# Altium schematic symbol library Regulator_Switching.SchLib: 1070 symbols (part 1 of 9)
Pins are listed as number, name and electrical type; pins without a type are passive.

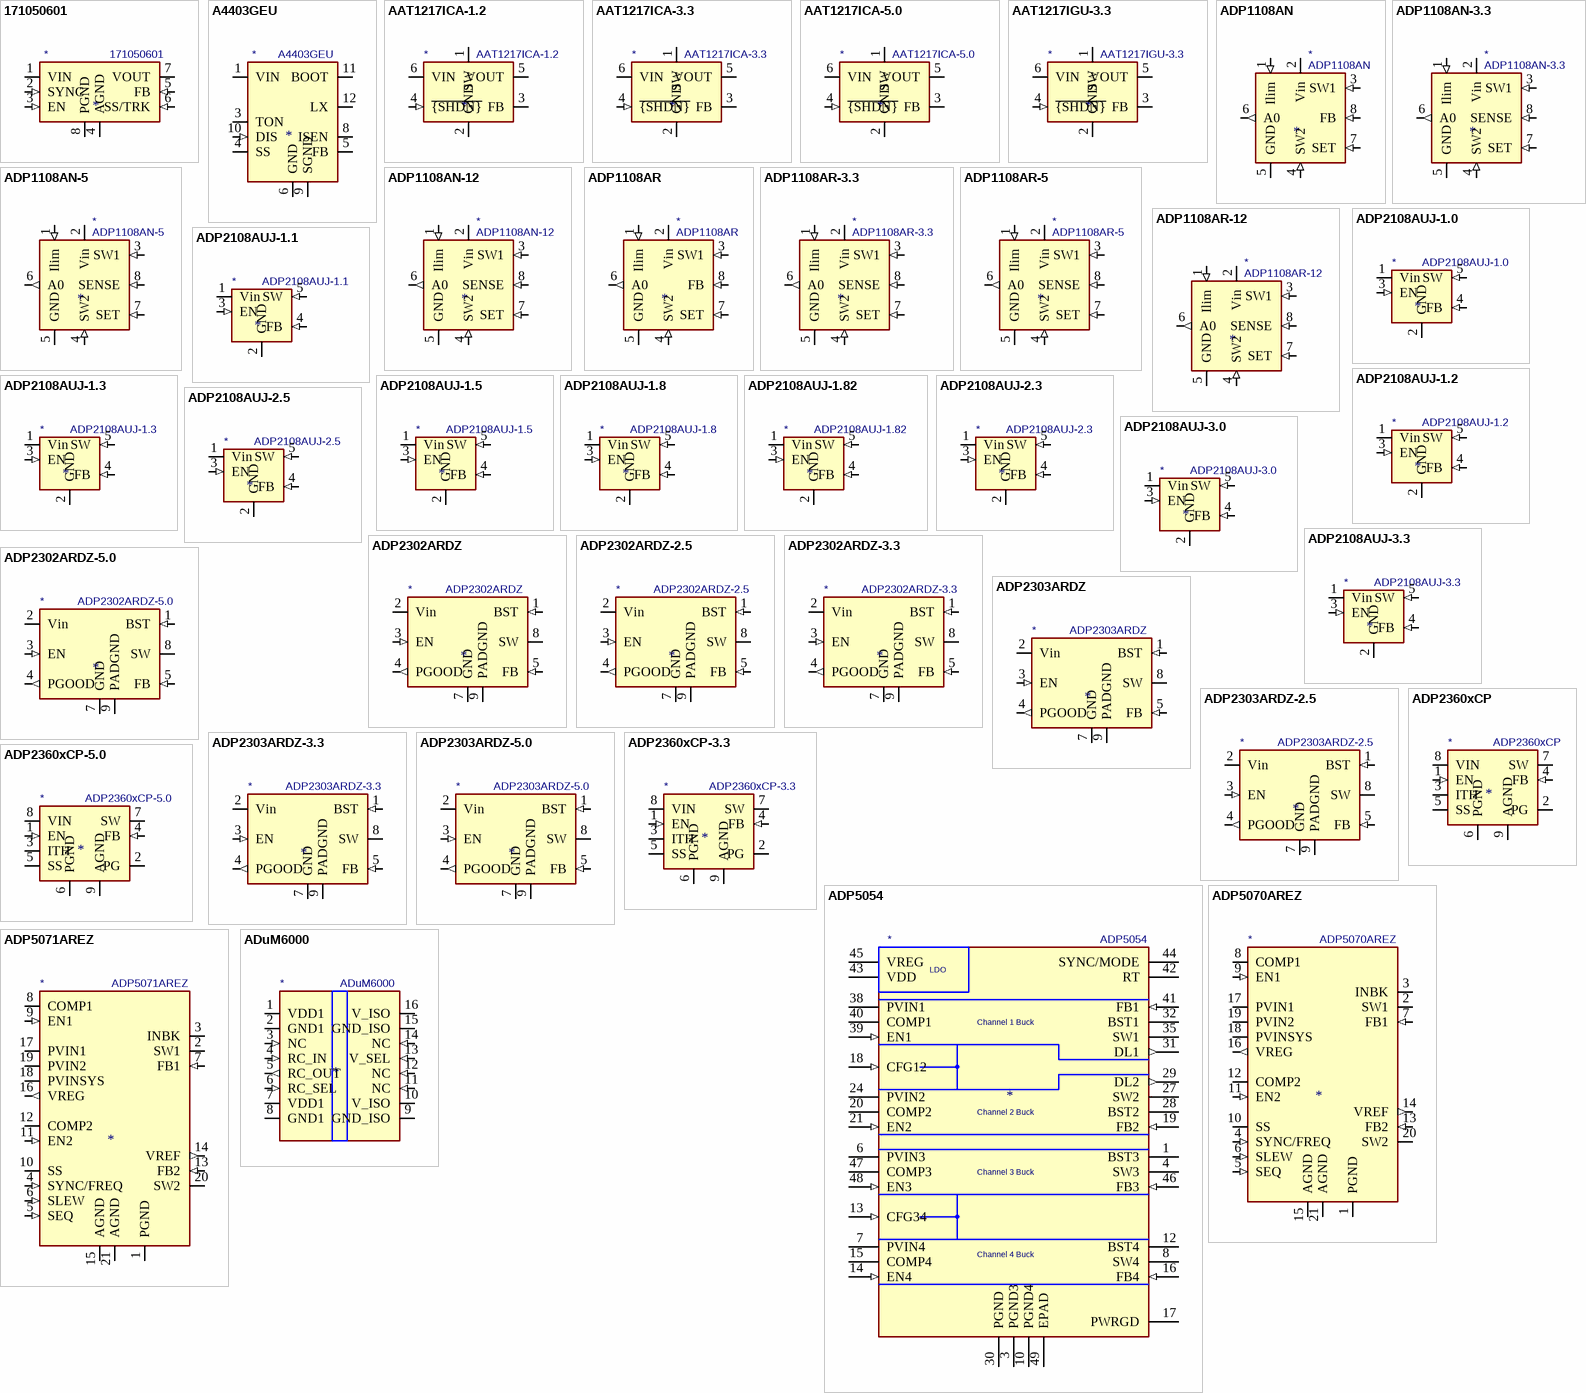
[diagram p0: symbols 171050601 to ADuM6000]

## 171050601
designator *  value 171050601
ki_keywords: power module regulator; ki_description: MagI3C Power Module, Variable Step Down Regulator Module, 6 to 36V Input Voltage, 0.8 to 6V, 5A Output, TO-263; ki_fp_filters: TO*263*TabPin8*; Footprint: Package_TO_SOT_SMD:TO-263-7_TabPin8; Supplier: https://katalog.we-online.de/pm/datasheet/171050601.pdf
footprint TO-263-7_TabPin8
pins: 1 VIN (power), 2 SYNC (in), 3 EN (in), 4 AGND (power), 5 FB (in), 6 SS/TRK (in), 7 VOUT (power), 8 PGND (power)

## A4403GEU
designator *  value A4403GEU
ki_keywords: buck regulator adjustable; ki_description: Valley current mode buck converter, 46V, 3A, up to 2MHz, QFN-16; ki_fp_filters: QFN*1EP*4x4mm*P0.65mm*EP2.7x2.7mm*; Footprint: Package_DFN_QFN:QFN-16-1EP_4x4mm_P0.65mm_EP2.7x2.7mm; Supplier: https://www.allegromicro.com/~/media/Files/Datasheets/A4403-Datasheet.ashx
footprint QFN-16-1EP_4x4mm_P0.65mm_EP2.7x2.7mm
pins: 1 VIN (power), 2 GND hidden, 3 TON, 4 SS, 5 FB, 6 GND (power), 7 GND hidden, 8 ISEN, 9 SGND, 10 DIS (in), 11 BOOT, 12 LX, 13 GND hidden, 14 GND hidden, 15 GND hidden, 16 GND hidden, 17 GND hidden

## AAT1217ICA-1.2
designator *  value AAT1217ICA-1.2
ki_keywords: regulator step-up adjustable; ki_description: 600mA, 2.5-5.5V, 1.2MHz, Micropower Synchronous Step-Up Converter, TSOT-23-6; ki_fp_filters: TSOT?23*; Footprint: Package_TO_SOT_SMD:TSOT-23-6; Supplier: http://www.skyworksinc.com/uploads/documents/AAT1217_202050B.pdf
footprint TSOT-23-6
pins: 1 SW, 2 GND (power), 3 FB, 4 ~{{SHDN}} (in), 5 VOUT (power), 6 VIN (power)

## AAT1217ICA-3.3
designator *  value AAT1217ICA-3.3
ki_keywords: regulator step-up; ki_description: 600mA, 3.3V, 1.2MHz, Micropower Synchronous Step-Up Converter, TSOT-23-6; ki_fp_filters: TSOT?23*; Footprint: Package_TO_SOT_SMD:TSOT-23-6; Supplier: http://www.skyworksinc.com/uploads/documents/AAT1217_202050B.pdf
footprint TSOT-23-6
pins: 1 SW, 2 GND (power), 3 FB, 4 ~{{SHDN}} (in), 5 VOUT (power), 6 VIN (power)

## AAT1217ICA-5.0
designator *  value AAT1217ICA-5.0
ki_keywords: regulator step-up; ki_description: 600mA, 5.0V, 1.2MHz, Micropower Synchronous Step-Up Converter, TSOT-23-6; ki_fp_filters: TSOT?23*; Footprint: Package_TO_SOT_SMD:TSOT-23-6; Supplier: http://www.skyworksinc.com/uploads/documents/AAT1217_202050B.pdf
footprint TSOT-23-6
pins: 1 SW, 2 GND (power), 3 FB, 4 ~{{SHDN}} (in), 5 VOUT (power), 6 VIN (power)

## AAT1217IGU-3.3
designator *  value AAT1217IGU-3.3
ki_keywords: regulator step-up; ki_description: 600mA, 3.3V, 1.2MHz, Micropower Synchronous Step-Up Converter, SOT-23-6; ki_fp_filters: SOT?23*; Footprint: Package_TO_SOT_SMD:SOT-23-6; Supplier: http://www.skyworksinc.com/uploads/documents/AAT1217_202050B.pdf
footprint SOT-23-6
pins: 1 SW, 2 GND (power), 3 FB, 4 ~{{SHDN}} (in), 5 VOUT (power), 6 VIN (power)

## ADP1108AN
designator *  value ADP1108AN
ki_keywords: switching buck boost converter step-down step-up; ki_description: Micropower DC-DC converter, step-up or step-down operation, 2V-30Vin, adjustable output voltage, DIP-8; ki_fp_filters: DIP*W7.62mm*; Footprint: Package_DIP:DIP-8_W7.62mm; Supplier: https://www.analog.com/media/en/technical-documentation/data-sheets/ADP1108.pdf
footprint DIP-8_W7.62mm
pins: 1 Ilim (in), 2 Vin (power), 3 SW1 (in), 4 SW2 (in), 5 GND (power), 6 A0 (out), 7 SET (in), 8 FB (in)

## ADP1108AN-3.3
designator *  value ADP1108AN-3.3
ki_keywords: switching buck boost converter step-down step-up; ki_description: Micropower DC-DC converter, step-up or step-down operation, 2V-30Vin, 3.3V fixed output voltage, DIP-8; ki_fp_filters: DIP*W7.62mm*; Footprint: Package_DIP:DIP-8_W7.62mm; Supplier: https://www.analog.com/media/en/technical-documentation/data-sheets/ADP1108.pdf
footprint DIP-8_W7.62mm
pins: 1 Ilim (in), 2 Vin (power), 3 SW1 (in), 4 SW2 (in), 5 GND (power), 6 A0 (out), 7 SET (in), 8 SENSE (in)

## ADP1108AN-5
designator *  value ADP1108AN-5
ki_keywords: switching buck boost converter step-down step-up; ki_description: Micropower DC-DC converter, step-up or step-down operation, 2V-30Vin, 5V fixed output voltage, DIP-8; ki_fp_filters: DIP*W7.62mm*; Footprint: Package_DIP:DIP-8_W7.62mm; Supplier: https://www.analog.com/media/en/technical-documentation/data-sheets/ADP1108.pdf
footprint DIP-8_W7.62mm
pins: 1 Ilim (in), 2 Vin (power), 3 SW1 (in), 4 SW2 (in), 5 GND (power), 6 A0 (out), 7 SET (in), 8 SENSE (in)

## ADP1108AN-12
designator *  value ADP1108AN-12
ki_keywords: switching buck boost converter step-down step-up; ki_description: Micropower DC-DC converter, step-up or step-down operation, 2V-30Vin, 12V fixed output voltage, DIP-8; ki_fp_filters: DIP*W7.62mm*; Footprint: Package_DIP:DIP-8_W7.62mm; Supplier: https://www.analog.com/media/en/technical-documentation/data-sheets/ADP1108.pdf
footprint DIP-8_W7.62mm
pins: 1 Ilim (in), 2 Vin (power), 3 SW1 (in), 4 SW2 (in), 5 GND (power), 6 A0 (out), 7 SET (in), 8 SENSE (in)

## ADP1108AR
designator *  value ADP1108AR
ki_keywords: switching buck boost converter step-down step-up; ki_description: Micropower DC-DC converter, step-up or step-down operation, 2V-30Vin, adjustable output voltage, DIP-8; ki_fp_filters: SOIC*3.9x4.9mm*; Footprint: Package_SO:SOIC-8_3.9x4.9mm_P1.27mm; Supplier: https://www.analog.com/media/en/technical-documentation/data-sheets/ADP1108.pdf
footprint SOIC-8_3.9x4.9mm_P1.27mm
pins: 1 Ilim (in), 2 Vin (power), 3 SW1 (in), 4 SW2 (in), 5 GND (power), 6 A0 (out), 7 SET (in), 8 FB (in)

## ADP1108AR-3.3
designator *  value ADP1108AR-3.3
ki_keywords: switching buck boost converter step-down step-up; ki_description: Micropower DC-DC converter, step-up or step-down operation, 2V-30Vin, 3.3V fixed output voltage, DIP-8; ki_fp_filters: SOIC*3.9x4.9mm*P1.27mm*; Footprint: Package_SO:SOIC-8_3.9x4.9mm_P1.27mm; Supplier: https://www.analog.com/media/en/technical-documentation/data-sheets/ADP1108.pdf
footprint SOIC-8_3.9x4.9mm_P1.27mm
pins: 1 Ilim (in), 2 Vin (power), 3 SW1 (in), 4 SW2 (in), 5 GND (power), 6 A0 (out), 7 SET (in), 8 SENSE (in)

## ADP1108AR-5
designator *  value ADP1108AR-5
ki_keywords: switching buck boost converter step-down step-up; ki_description: Micropower DC-DC converter, step-up or step-down operation, 2V-30Vin, 5V fixed output voltage, DIP-8; ki_fp_filters: SOIC*3.9x4.9mm*P1.27mm*; Footprint: Package_SO:SOIC-8_3.9x4.9mm_P1.27mm; Supplier: https://www.analog.com/media/en/technical-documentation/data-sheets/ADP1108.pdf
footprint SOIC-8_3.9x4.9mm_P1.27mm
pins: 1 Ilim (in), 2 Vin (power), 3 SW1 (in), 4 SW2 (in), 5 GND (power), 6 A0 (out), 7 SET (in), 8 SENSE (in)

## ADP1108AR-12
designator *  value ADP1108AR-12
ki_keywords: switching buck boost converter step-down step-up; ki_description: Micropower DC-DC converter, step-up or step-down operation, 2V-30Vin, 12V fixed output voltage, DIP-8; ki_fp_filters: SOIC*3.9x4.9mm*P1.27mm*; Footprint: Package_SO:SOIC-8_3.9x4.9mm_P1.27mm; Supplier: https://www.analog.com/media/en/technical-documentation/data-sheets/ADP1108.pdf
footprint SOIC-8_3.9x4.9mm_P1.27mm
pins: 1 Ilim (in), 2 Vin (power), 3 SW1 (in), 4 SW2 (in), 5 GND (power), 6 A0 (out), 7 SET (in), 8 SENSE (in)

## ADP2108AUJ-1.0
designator *  value ADP2108AUJ-1.0
ki_keywords: Voltage regulator switching buck fixed output analog; ki_description: 3MHz switching bucK regulator, 600mA 1.0V output voltage,; ki_fp_filters: TSOT?23*; Footprint: Package_TO_SOT_SMD:TSOT-23-5; Supplier: https://www.analog.com/media/en/technical-documentation/data-sheets/ADP2108.pdf
footprint TSOT-23-5
pins: 1 Vin (power), 2 GND (power), 3 EN (in), 4 FB (in), 5 SW (in)

## ADP2108AUJ-1.1
designator *  value ADP2108AUJ-1.1
ki_keywords: Voltage regulator switching buck fixed output analog; ki_description: 3MHz switching bucK regulator, 600mA 1.1V output voltage,; ki_fp_filters: TSOT?23*; Footprint: Package_TO_SOT_SMD:TSOT-23-5; Supplier: https://www.analog.com/media/en/technical-documentation/data-sheets/ADP2108.pdf
footprint TSOT-23-5
pins: 1 Vin (power), 2 GND (power), 3 EN (in), 4 FB (in), 5 SW (in)

## ADP2108AUJ-1.2
designator *  value ADP2108AUJ-1.2
ki_keywords: Voltage regulator switching buck fixed output analog; ki_description: 3MHz switching bucK regulator, 600mA 1.2V output voltage,; ki_fp_filters: TSOT?23*; Footprint: Package_TO_SOT_SMD:TSOT-23-5; Supplier: https://www.analog.com/media/en/technical-documentation/data-sheets/ADP2108.pdf
footprint TSOT-23-5
pins: 1 Vin (power), 2 GND (power), 3 EN (in), 4 FB (in), 5 SW (in)

## ADP2108AUJ-1.3
designator *  value ADP2108AUJ-1.3
ki_keywords: Voltage regulator switching buck fixed output analog; ki_description: 3MHz switching bucK regulator, 600mA 1.3V output voltage,; ki_fp_filters: TSOT?23*; Footprint: Package_TO_SOT_SMD:TSOT-23-5; Supplier: https://www.analog.com/media/en/technical-documentation/data-sheets/ADP2108.pdf
footprint TSOT-23-5
pins: 1 Vin (power), 2 GND (power), 3 EN (in), 4 FB (in), 5 SW (in)

## ADP2108AUJ-1.5
designator *  value ADP2108AUJ-1.5
ki_keywords: Voltage regulator switching buck fixed output analog; ki_description: 3MHz switching bucK regulator, 600mA 1.5V output voltage,; ki_fp_filters: TSOT?23*; Footprint: Package_TO_SOT_SMD:TSOT-23-5; Supplier: https://www.analog.com/media/en/technical-documentation/data-sheets/ADP2108.pdf
footprint TSOT-23-5
pins: 1 Vin (power), 2 GND (power), 3 EN (in), 4 FB (in), 5 SW (in)

## ADP2108AUJ-1.8
designator *  value ADP2108AUJ-1.8
ki_keywords: Voltage regulator switching buck fixed output analog; ki_description: 3MHz switching bucK regulator, 600mA 1.8V output voltage,; ki_fp_filters: TSOT?23*; Footprint: Package_TO_SOT_SMD:TSOT-23-5; Supplier: https://www.analog.com/media/en/technical-documentation/data-sheets/ADP2108.pdf
footprint TSOT-23-5
pins: 1 Vin (power), 2 GND (power), 3 EN (in), 4 FB (in), 5 SW (in)

## ADP2108AUJ-1.82
designator *  value ADP2108AUJ-1.82
ki_keywords: Voltage regulator switching buck fixed output analog; ki_description: 3MHz switching bucK regulator, 600mA 1.82V output voltage,; ki_fp_filters: TSOT?23*; Footprint: Package_TO_SOT_SMD:TSOT-23-5; Supplier: https://www.analog.com/media/en/technical-documentation/data-sheets/ADP2108.pdf
footprint TSOT-23-5
pins: 1 Vin (power), 2 GND (power), 3 EN (in), 4 FB (in), 5 SW (in)

## ADP2108AUJ-2.3
designator *  value ADP2108AUJ-2.3
ki_keywords: Voltage regulator switching buck fixed output analog; ki_description: 3MHz switching bucK regulator, 600mA 2.3V output voltage,; ki_fp_filters: TSOT?23*; Footprint: Package_TO_SOT_SMD:TSOT-23-5; Supplier: https://www.analog.com/media/en/technical-documentation/data-sheets/ADP2108.pdf
footprint TSOT-23-5
pins: 1 Vin (power), 2 GND (power), 3 EN (in), 4 FB (in), 5 SW (in)

## ADP2108AUJ-2.5
designator *  value ADP2108AUJ-2.5
ki_keywords: Voltage regulator switching buck fixed output analog; ki_description: 3MHz switching bucK regulator, 600mA 2.5V output voltage,; ki_fp_filters: TSOT?23*; Footprint: Package_TO_SOT_SMD:TSOT-23-5; Supplier: https://www.analog.com/media/en/technical-documentation/data-sheets/ADP2108.pdf
footprint TSOT-23-5
pins: 1 Vin (power), 2 GND (power), 3 EN (in), 4 FB (in), 5 SW (in)

## ADP2108AUJ-3.0
designator *  value ADP2108AUJ-3.0
ki_keywords: Voltage regulator switching buck fixed output analog; ki_description: 3MHz switching bucK regulator, 600mA 3.0V output voltage,; ki_fp_filters: TSOT?23*; Footprint: Package_TO_SOT_SMD:TSOT-23-5; Supplier: https://www.analog.com/media/en/technical-documentation/data-sheets/ADP2108.pdf
footprint TSOT-23-5
pins: 1 Vin (power), 2 GND (power), 3 EN (in), 4 FB (in), 5 SW (in)

## ADP2108AUJ-3.3
designator *  value ADP2108AUJ-3.3
ki_keywords: Voltage regulator switching buck fixed output analog; ki_description: 3MHz switching bucK regulator, 600mA 3.3V output voltage,; ki_fp_filters: TSOT?23*; Footprint: Package_TO_SOT_SMD:TSOT-23-5; Supplier: https://www.analog.com/media/en/technical-documentation/data-sheets/ADP2108.pdf
footprint TSOT-23-5
pins: 1 Vin (power), 2 GND (power), 3 EN (in), 4 FB (in), 5 SW (in)

## ADP2302ARDZ
designator *  value ADP2302ARDZ
ki_keywords: Step-Down Regulator; ki_description: Nonsynchronous Step-Down Regulator 2 Amp Vout Adjustable SOIC-8; ki_fp_filters: SOIC*1EP*3.9x4.9mm*P1.27mm*; Footprint: Package_SO:SOIC-8-1EP_3.9x4.9mm_P1.27mm_EP2.29x3mm; Supplier: https://www.analog.com/media/en/technical-documentation/data-sheets/ADP2302_2303.pdf
footprint SOIC-8-1EP_3.9x4.9mm_P1.27mm_EP2.29x3mm
pins: 1 BST (in), 2 Vin (power), 3 EN (in), 4 PGOOD (out), 5 FB (in), 6 NC (in) hidden, 7 GND (power), 8 SW (power), 9 PADGND (power)

## ADP2302ARDZ-2.5
designator *  value ADP2302ARDZ-2.5
ki_keywords: Step-Down Regulator; ki_description: Nonsynchronous Step-Down Regulator 2 Amp Vout 2.5v SOIC-8; ki_fp_filters: SOIC*1EP*3.9x4.9mm*P1.27mm*; Footprint: Package_SO:SOIC-8-1EP_3.9x4.9mm_P1.27mm_EP2.29x3mm; Supplier: https://www.analog.com/media/en/technical-documentation/data-sheets/ADP2302_2303.pdf
footprint SOIC-8-1EP_3.9x4.9mm_P1.27mm_EP2.29x3mm
pins: 1 BST (in), 2 Vin (power), 3 EN (in), 4 PGOOD (out), 5 FB (in), 6 NC (in) hidden, 7 GND (power), 8 SW (power), 9 PADGND (power)

## ADP2302ARDZ-3.3
designator *  value ADP2302ARDZ-3.3
ki_keywords: Step-Down Regulator; ki_description: Nonsynchronous Step-Down Regulator 2 Amp Vout 3.3v SOIC-8; ki_fp_filters: SOIC*1EP*3.9x4.9mm*P1.27mm*; Footprint: Package_SO:SOIC-8-1EP_3.9x4.9mm_P1.27mm_EP2.29x3mm; Supplier: https://www.analog.com/media/en/technical-documentation/data-sheets/ADP2302_2303.pdf
footprint SOIC-8-1EP_3.9x4.9mm_P1.27mm_EP2.29x3mm
pins: 1 BST (in), 2 Vin (power), 3 EN (in), 4 PGOOD (out), 5 FB (in), 6 NC (in) hidden, 7 GND (power), 8 SW (power), 9 PADGND (power)

## ADP2302ARDZ-5.0
designator *  value ADP2302ARDZ-5.0
ki_keywords: Step-Down Regulator; ki_description: Nonsynchronous Step-Down Regulator 2 Amp Vout 5.0v SOIC-8; ki_fp_filters: SOIC*1EP*3.9x4.9mm*P1.27mm*; Footprint: Package_SO:SOIC-8-1EP_3.9x4.9mm_P1.27mm_EP2.29x3mm; Supplier: https://www.analog.com/media/en/technical-documentation/data-sheets/ADP2302_2303.pdf
footprint SOIC-8-1EP_3.9x4.9mm_P1.27mm_EP2.29x3mm
pins: 1 BST (in), 2 Vin (power), 3 EN (in), 4 PGOOD (out), 5 FB (in), 6 NC (in) hidden, 7 GND (power), 8 SW (power), 9 PADGND (power)

## ADP2303ARDZ
designator *  value ADP2303ARDZ
ki_keywords: Step-Down Regulator; ki_description: Nonsynchronous Step-Down Regulator 3 Amp Vout Adjustable SOIC-8; ki_fp_filters: SOIC*1EP*3.9x4.9mm*P1.27mm*; Footprint: Package_SO:SOIC-8-1EP_3.9x4.9mm_P1.27mm_EP2.29x3mm; Supplier: https://www.analog.com/media/en/technical-documentation/data-sheets/ADP2302_2303.pdf
footprint SOIC-8-1EP_3.9x4.9mm_P1.27mm_EP2.29x3mm
pins: 1 BST (in), 2 Vin (power), 3 EN (in), 4 PGOOD (out), 5 FB (in), 6 NC (in) hidden, 7 GND (power), 8 SW (power), 9 PADGND (power)

## ADP2303ARDZ-2.5
designator *  value ADP2303ARDZ-2.5
ki_keywords: Step-Down Regulator; ki_description: Nonsynchronous Step-Down Regulator 3 Amp Vout 2.5v SOIC-8; ki_fp_filters: SOIC*1EP*3.9x4.9mm*P1.27mm*; Footprint: Package_SO:SOIC-8-1EP_3.9x4.9mm_P1.27mm_EP2.29x3mm; Supplier: https://www.analog.com/media/en/technical-documentation/data-sheets/ADP2302_2303.pdf
footprint SOIC-8-1EP_3.9x4.9mm_P1.27mm_EP2.29x3mm
pins: 1 BST (in), 2 Vin (power), 3 EN (in), 4 PGOOD (out), 5 FB (in), 6 NC (in) hidden, 7 GND (power), 8 SW (power), 9 PADGND (power)

## ADP2303ARDZ-3.3
designator *  value ADP2303ARDZ-3.3
ki_keywords: Step-Down Regulator; ki_description: Nonsynchronous Step-Down Regulator 3 Amp Vout 3.3v SOIC-8; ki_fp_filters: SOIC*1EP*3.9x4.9mm*P1.27mm*; Footprint: Package_SO:SOIC-8-1EP_3.9x4.9mm_P1.27mm_EP2.29x3mm; Supplier: https://www.analog.com/media/en/technical-documentation/data-sheets/ADP2302_2303.pdf
footprint SOIC-8-1EP_3.9x4.9mm_P1.27mm_EP2.29x3mm
pins: 1 BST (in), 2 Vin (power), 3 EN (in), 4 PGOOD (out), 5 FB (in), 6 NC (in) hidden, 7 GND (power), 8 SW (power), 9 PADGND (power)

## ADP2303ARDZ-5.0
designator *  value ADP2303ARDZ-5.0
ki_keywords: Step-Down Regulator; ki_description: Nonsynchronous Step-Down Regulator 3 Amp Vout 5.0v SOIC-8; ki_fp_filters: SOIC*1EP*3.9x4.9mm*P1.27mm*; Footprint: Package_SO:SOIC-8-1EP_3.9x4.9mm_P1.27mm_EP2.29x3mm; Supplier: https://www.analog.com/media/en/technical-documentation/data-sheets/ADP2302_2303.pdf
footprint SOIC-8-1EP_3.9x4.9mm_P1.27mm_EP2.29x3mm
pins: 1 BST (in), 2 Vin (power), 3 EN (in), 4 PGOOD (out), 5 FB (in), 6 NC (in) hidden, 7 GND (power), 8 SW (power), 9 PADGND (power)

## ADP2360xCP
designator *  value ADP2360xCP
ki_keywords: Step-Down Buck Regulator; ki_description: High Efficiency Buck Regulator, Vin 60V, Vout Adjustable, 50mA, LFCSP-8; ki_fp_filters: LFCSP*1EP*3x3mm*P0.65mm*; Footprint: Package_CSP:LFCSP-WD-8-1EP_3x3mm_P0.65mm_EP1.6x2.44mm; Supplier: https://www.analog.com/media/en/technical-documentation/data-sheets/ADP2360.pdf
footprint LFCSP-WD-8-1EP_3x3mm_P0.65mm_EP1.6x2.44mm
pins: 1 EN (in), 2 PG (oc), 3 ITH, 4 FB (in), 5 SS, 6 PGND (power), 7 SW (power), 8 VIN (power), 9 AGND (power)

## ADP2360xCP-3.3
designator *  value ADP2360xCP-3.3
ki_keywords: Step-Down Buck Regulator; ki_description: High Efficiency Buck Regulator, Vin 60V, Vout 3.3V, 50mA, LFCSP-8; ki_fp_filters: LFCSP*1EP*3x3mm*P0.65mm*; Footprint: Package_CSP:LFCSP-WD-8-1EP_3x3mm_P0.65mm_EP1.6x2.44mm; Supplier: https://www.analog.com/media/en/technical-documentation/data-sheets/ADP2360.pdf
footprint LFCSP-WD-8-1EP_3x3mm_P0.65mm_EP1.6x2.44mm
pins: 1 EN (in), 2 PG (oc), 3 ITH, 4 FB (in), 5 SS, 6 PGND (power), 7 SW (power), 8 VIN (power), 9 AGND (power)

## ADP2360xCP-5.0
designator *  value ADP2360xCP-5.0
ki_keywords: Step-Down Buck Regulator; ki_description: High Efficiency Buck Regulator, Vin 60V, Vout 5.0V, 50mA, LFCSP-8; ki_fp_filters: LFCSP*1EP*3x3mm*P0.65mm*; Footprint: Package_CSP:LFCSP-WD-8-1EP_3x3mm_P0.65mm_EP1.6x2.44mm; Supplier: https://www.analog.com/media/en/technical-documentation/data-sheets/ADP2360.pdf
footprint LFCSP-WD-8-1EP_3x3mm_P0.65mm_EP1.6x2.44mm
pins: 1 EN (in), 2 PG (oc), 3 ITH, 4 FB (in), 5 SS, 6 PGND (power), 7 SW (power), 8 VIN (power), 9 AGND (power)

## ADP5054
designator *  value ADP5054
ki_keywords: quad regulator dcdc buck synchronizable parallel; ki_description: 250kHz to 2MHz, 6A/6A/2A/2A Quad Buck Regulator, -40 to +125C, QFN-48; ki_fp_filters: QFN*1EP*7x7mm*P0.5mm*; Footprint: Package_DFN_QFN:QFN-48-1EP_7x7mm_P0.5mm_EP5.15x5.15mm; Supplier: https://www.analog.com/media/en/technical-documentation/data-sheets/ADP5054.pdf
footprint QFN-48-1EP_7x7mm_P0.5mm_EP5.15x5.15mm
pins: 1 BST3 (power), 2 PGND3 hidden, 3 PGND3 (power), 4 SW3 (power), 5 SW3 hidden, 6 PVIN3 (power), 7 PVIN4 (power), 8 SW4 (power), 9 SW4 hidden, 10 PGND4 (power), 11 PGND4 hidden, 12 BST4 (power), 13 CFG34 (in), 14 EN4 (in), 15 COMP4, 16 FB4 (in), 17 PWRGD (oc), 18 CFG12 (in), 19 FB2 (in), 20 COMP2, 21 EN2 (in), 22 PVIN2 hidden, 23 PVIN2 hidden, 24 PVIN2 (power), 25 SW2 hidden, 26 SW2 hidden, 27 SW2 (power), 28 BST2 (power), 29 DL2 (out), 30 PGND (power), 31 DL1 (out), 32 BST1 (power), 33 SW1 hidden, 34 SW1 hidden, 35 SW1 (power), 36 PVIN1 hidden, 37 PVIN1 hidden, 38 PVIN1 (power), 39 EN1 (in), 40 COMP1, 41 FB1 (in), 42 RT, 43 VDD (power), 44 SYNC/MODE, 45 VREG (power), 46 FB3 (in), 47 COMP3, 48 EN3 (in), 49 EPAD (power)
text: LDO; Channel 1 Buck; Channel 2 Buck; Channel 3 Buck; Channel 4 Buck

## ADP5070AREZ
designator *  value ADP5070AREZ
ki_keywords: voltage regulator switching inverter double positive negative; ki_description: 1A/0.6A DC-to-DC Switching Regulator with Independent Positive and Negative Outputs; ki_fp_filters: ETSSOP*1EP?4.4x6.5mm?P0.65mm?EP3x4.2mm*; Footprint: Package_SO:ETSSOP-20-1EP_4.4x6.5mm_P0.65mm_EP3x4.2mm; Supplier: https://www.analog.com/media/en/technical-documentation/data-sheets/ADP5070.pdf
footprint ETSSOP-20-1EP_4.4x6.5mm_P0.65mm_EP3x4.2mm
pins: 1 PGND (power), 2 SW1 (power), 3 INBK (power), 4 SYNC/FREQ (in), 5 SEQ (in), 6 SLEW (in), 7 FB1 (in), 8 COMP1, 9 EN1 (in), 10 SS, 11 EN2 (in), 12 COMP2, 13 FB2 (in), 14 VREF (out), 15 AGND (power), 16 VREG (out), 17 PVIN1 (power), 18 PVINSYS (power), 19 PVIN2 (power), 20 SW2 (power), 21 AGND (power)

## ADP5071AREZ
designator *  value ADP5071AREZ
ki_keywords: voltage regulator switching inverter double positive negative; ki_description: 2A/1.2A DC-to-DC Switching Regulator with Independent Positive and Negative Outputs; ki_fp_filters: ETSSOP*1EP?4.4x6.5mm?P0.65mm?EP3x4.2mm*; Footprint: Package_SO:ETSSOP-20-1EP_4.4x6.5mm_P0.65mm_EP3x4.2mm; Supplier: https://www.analog.com/media/en/technical-documentation/data-sheets/ADP5071.pdf
footprint ETSSOP-20-1EP_4.4x6.5mm_P0.65mm_EP3x4.2mm
pins: 1 PGND (power), 2 SW1 (power), 3 INBK (power), 4 SYNC/FREQ (in), 5 SEQ (in), 6 SLEW (in), 7 FB1 (in), 8 COMP1, 9 EN1 (in), 10 SS, 11 EN2 (in), 12 COMP2, 13 FB2 (in), 14 VREF (out), 15 AGND (power), 16 VREG (out), 17 PVIN1 (power), 18 PVINSYS (power), 19 PVIN2 (power), 20 SW2 (power), 21 AGND (power)

## ADuM6000
designator *  value ADuM6000
ki_keywords: Isolated DC-to-DC Converter 5kV; ki_description: Isolated 5 kV DC-to-DC Converter; ki_fp_filters: SOIC*7.5x12.8mm*P1.27mm* SOIC*7.5x10.3mm*P1.27mm*; Supplier: https://www.analog.com/media/en/technical-documentation/data-sheets/ADuM6000.PDF
pins: 1 VDD1 (power), 2 GND1 (power), 3 NC (in), 4 RC_IN (in), 5 RC_OUT (out), 6 RC_SEL (in), 7 VDD1 (power), 8 GND1 (power), 9 GND_ISO (power), 10 V_ISO, 11 NC (in), 12 NC (in), 13 V_SEL (in), 14 NC (in), 15 GND_ISO, 16 V_ISO (power)

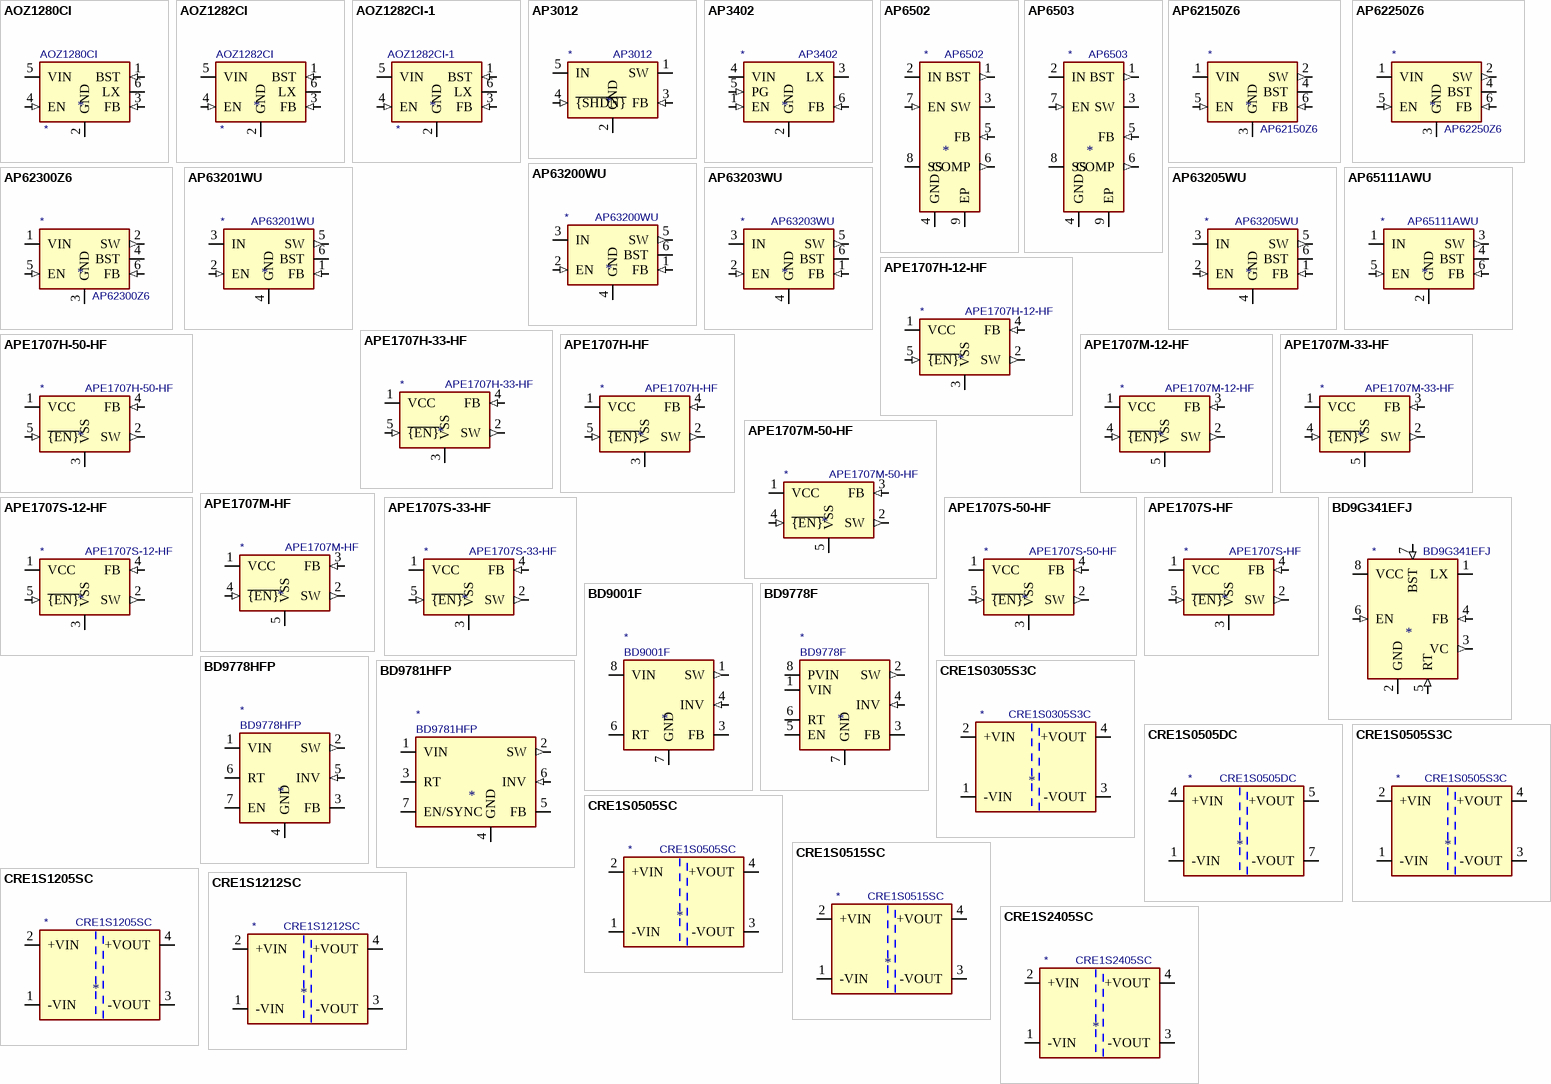
[diagram p1: symbols AOZ1280CI to CRE1S2405SC]

## AOZ1280CI
designator *  value AOZ1280CI
ki_keywords: switching buck converter; ki_description: 1.2 A Simple Buck Regulator, 3-26V input, 1.5Mhz; ki_fp_filters: SOT?23*; Footprint: Package_TO_SOT_SMD:SOT-23-6; Supplier: http://aosmd.com/res/data_sheets/AOZ1280CI.pdf
footprint SOT-23-6
pins: 1 BST (in), 2 GND (power), 3 FB (in), 4 EN (in), 5 VIN (power), 6 LX (power)

## AOZ1282CI
designator *  value AOZ1282CI
ki_keywords: switching buck converter; ki_description: 1.2 A Simple Buck Regulator, 4.5-36V input, 450kHz; ki_fp_filters: SOT?23*; Footprint: Package_TO_SOT_SMD:SOT-23-6; Supplier: http://aosmd.com/res/data_sheets/AOZ1282CI.pdf
footprint SOT-23-6
pins: 1 BST (in), 2 GND (power), 3 FB (in), 4 EN (in), 5 VIN (power), 6 LX (power)

## AOZ1282CI-1
designator *  value AOZ1282CI-1
ki_keywords: switching buck converter; ki_description: 600 mA Simple Buck Regulator, 4.5-36V input, 1MHz; ki_fp_filters: SOT?23*; Footprint: Package_TO_SOT_SMD:SOT-23-6; Supplier: http://www.aosmd.com/res/data_sheets/AOZ1282CI-1.pdf
footprint SOT-23-6
pins: 1 BST (in), 2 GND (power), 3 FB (in), 4 EN (in), 5 VIN (power), 6 LX (power)

## AP3012
designator *  value AP3012
ki_keywords: Step-Up Boost Voltage Regulator; ki_description: 500mA, Adjustable Step-Up Voltage Regulator, 1.5MHz Frequency, SOT-23-5; ki_fp_filters: SOT?23*; Footprint: Package_TO_SOT_SMD:SOT-23-5; Supplier: https://www.diodes.com/assets/Datasheets/AP3012.pdf
footprint SOT-23-5
pins: 1 SW, 2 GND (power), 3 FB (in), 4 ~{{SHDN}} (in), 5 IN (power)

## AP3402
designator *  value AP3402
ki_keywords: buck switching converter; ki_description: 1.0MHz 2A Step-Down DC-DC Buck Converter, TSOT-23-6; ki_fp_filters: TSOT?23*; Footprint: Package_TO_SOT_SMD:TSOT-23-6; Supplier: https://www.diodes.com/assets/Datasheets/AP3402.pdf
footprint TSOT-23-6
pins: 1 EN (in), 2 GND (power), 3 LX (power), 4 VIN (power), 5 PG (in), 6 FB (in)

## AP6502
designator *  value AP6502
ki_keywords: buck switching converter; ki_description: 340kHz 18V 2A Synchronous DC/DC Buck Converter; ki_fp_filters: Diodes_SO-8EP*; Supplier: https://www.diodes.com/assets/Datasheets/AP6502.pdf
pins: 1 BST (out), 2 IN (power), 3 SW (power), 4 GND (power), 5 FB (in), 6 COMP (out), 7 EN (in), 8 SS (hiz), 9 EP (power)

## AP6503
designator *  value AP6503
ki_keywords: buck switching converter; ki_description: 340kHz 23V 3A Synchonous DC/DC Buck Converter; ki_fp_filters: Diodes_SO-8EP*; Supplier: https://www.diodes.com/assets/Datasheets/AP6503.pdf
pins: 1 BST (out), 2 IN (power), 3 SW (power), 4 GND (power), 5 FB (in), 6 COMP (out), 7 EN (in), 8 SS (hiz), 9 EP (power)

## AP62150Z6
designator *  value AP62150Z6
ki_keywords: 1.5A 1.3MHz PWM Buck DC/DC; ki_description: 1.5A, 1.3MHz Buck DC/DC Converter, adjustable output voltage, SOT-563; ki_fp_filters: SOT?563*; Footprint: Package_TO_SOT_SMD:SOT-563; Supplier: https://www.diodes.com/assets/Datasheets/AP62150.pdf
footprint SOT-563
pins: 1 VIN (power), 2 SW (out), 3 GND (power), 4 BST, 5 EN (in), 6 FB (in)

## AP62250Z6
designator *  value AP62250Z6
ki_keywords: 2.5A 1.3MHz PWM Buck DC/DC; ki_description: 2.5A, 1.3MHz Buck DC/DC Converter, adjustable output voltage, SOT-563; ki_fp_filters: SOT?563*; Footprint: Package_TO_SOT_SMD:SOT-563; Supplier: https://www.diodes.com/assets/Datasheets/AP62250.pdf
footprint SOT-563
pins: 1 VIN (power), 2 SW (out), 3 GND (power), 4 BST, 5 EN (in), 6 FB (in)

## AP62300Z6
designator *  value AP62300Z6
ki_keywords: 3A 1.3MHz PWM Buck DC/DC; ki_description: 3A, 1.3MHz Buck DC/DC Converter, adjustable output voltage, SOT-563; ki_fp_filters: SOT?563*; Footprint: Package_TO_SOT_SMD:SOT-563; Supplier: https://www.diodes.com/assets/Datasheets/AP62300_AP62301_AP62300T.pdf
footprint SOT-563
pins: 1 VIN (power), 2 SW (out), 3 GND (power), 4 BST, 5 EN (in), 6 FB (in)

## AP63200WU
designator *  value AP63200WU
ki_keywords: 2A Buck DC/DC; ki_description: 2A, 500kHz Buck DC/DC Converter, adjustable output voltage, TSOT-23-6; ki_fp_filters: TSOT?23*; Footprint: Package_TO_SOT_SMD:TSOT-23-6; Supplier: https://www.diodes.com/assets/Datasheets/AP63200-AP63201-AP63203-AP63205.pdf
footprint TSOT-23-6
pins: 1 FB (in), 2 EN (in), 3 IN (power), 4 GND (power), 5 SW (out), 6 BST

## AP63201WU
designator *  value AP63201WU
ki_keywords: 2A Buck DC/DC; ki_description: 2A, 500kHz Buck DC/DC Converter, adjustable output voltage, TSOT-23-6; ki_fp_filters: TSOT?23*; Footprint: Package_TO_SOT_SMD:TSOT-23-6; Supplier: https://www.diodes.com/assets/Datasheets/AP63200-AP63201-AP63203-AP63205.pdf
footprint TSOT-23-6
pins: 1 FB (in), 2 EN (in), 3 IN (power), 4 GND (power), 5 SW (out), 6 BST

## AP63203WU
designator *  value AP63203WU
ki_keywords: 2A Buck DC/DC; ki_description: 2A, 1.1MHz Buck DC/DC Converter, fixed 3.3V output voltage, TSOT-23-6; ki_fp_filters: TSOT?23*; Footprint: Package_TO_SOT_SMD:TSOT-23-6; Supplier: https://www.diodes.com/assets/Datasheets/AP63200-AP63201-AP63203-AP63205.pdf
footprint TSOT-23-6
pins: 1 FB (in), 2 EN (in), 3 IN (power), 4 GND (power), 5 SW (out), 6 BST

## AP63205WU
designator *  value AP63205WU
ki_keywords: 2A Buck DC/DC; ki_description: 2A, 1.1MHz Buck DC/DC Converter, fixed 5.0V output voltage, TSOT-23-6; ki_fp_filters: TSOT?23*; Footprint: Package_TO_SOT_SMD:TSOT-23-6; Supplier: https://www.diodes.com/assets/Datasheets/AP63200-AP63201-AP63203-AP63205.pdf
footprint TSOT-23-6
pins: 1 FB (in), 2 EN (in), 3 IN (power), 4 GND (power), 5 SW (out), 6 BST

## AP65111AWU
designator *  value AP65111AWU
ki_keywords: 1.5A 500kHz PWM Buck DC/DC; ki_description: 1.5A, 500kHz Buck DC/DC Converter, adjustable output voltage, TSOT-23-6; ki_fp_filters: TSOT?23*; Footprint: Package_TO_SOT_SMD:TSOT-23-6; Supplier: https://www.diodes.com/assets/Datasheets/AP65111A.pdf
footprint TSOT-23-6
pins: 1 IN (power), 2 GND (power), 3 SW (out), 4 BST, 5 EN (in), 6 FB (in)

## APE1707H-12-HF
designator *  value APE1707H-12-HF
ki_keywords: 12V 2A 150KHz PWM Buck DC/DC; ki_description: 2A, 150KHz PWM Buck DC/DC Converter, fixed 12.0V output voltage, TO-252-5 (D-PAK); ki_fp_filters: TO?252*TabPin3*; Footprint: Package_TO_SOT_SMD:TO-252-5_TabPin3; Supplier: http://pdf.datasheet.live/datasheets-1/advanced_power_electronics/APE1707H-12-HF.pdf
footprint TO-252-5_TabPin3
pins: 1 VCC (power), 2 SW (out), 3 VSS (power), 4 FB (in), 5 ~{{EN}} (in)

## APE1707H-33-HF
designator *  value APE1707H-33-HF
ki_keywords: 3.3V 2A 150KHz PWM Buck DC/DC; ki_description: 2A, 150KHz PWM Buck DC/DC Converter, fixed 3.3V output voltage, TO-252-5 (D-PAK); ki_fp_filters: TO?252*TabPin3*; Footprint: Package_TO_SOT_SMD:TO-252-5_TabPin3; Supplier: http://pdf.datasheet.live/datasheets-1/advanced_power_electronics/APE1707H-12-HF.pdf
footprint TO-252-5_TabPin3
pins: 1 VCC (power), 2 SW (out), 3 VSS (power), 4 FB (in), 5 ~{{EN}} (in)

## APE1707H-50-HF
designator *  value APE1707H-50-HF
ki_keywords: 5V 2A 150KHz PWM Buck DC/DC; ki_description: 2A, 150KHz PWM Buck DC/DC Converter, fixed 5.0V output voltage, TO-252-5 (D-PAK); ki_fp_filters: TO?252*TabPin3*; Footprint: Package_TO_SOT_SMD:TO-252-5_TabPin3; Supplier: http://pdf.datasheet.live/datasheets-1/advanced_power_electronics/APE1707H-12-HF.pdf
footprint TO-252-5_TabPin3
pins: 1 VCC (power), 2 SW (out), 3 VSS (power), 4 FB (in), 5 ~{{EN}} (in)

## APE1707H-HF
designator *  value APE1707H-HF
ki_keywords: Adjustable 2A 150KHz PWM Buck DC/DC; ki_description: 2A, 150KHz PWM Buck DC/DC Converter, adjustable output voltage, TO-252-5 (D-PAK); ki_fp_filters: TO?252*TabPin3*; Footprint: Package_TO_SOT_SMD:TO-252-5_TabPin3; Supplier: http://pdf.datasheet.live/datasheets-1/advanced_power_electronics/APE1707H-12-HF.pdf
footprint TO-252-5_TabPin3
pins: 1 VCC (power), 2 SW (out), 3 VSS (power), 4 FB (in), 5 ~{{EN}} (in)

## APE1707M-12-HF
designator *  value APE1707M-12-HF
ki_keywords: 12V 2A 150KHz PWM Buck DC/DC; ki_description: 2A, 150KHz PWM Buck DC/DC Converter, fixed 12.0V output voltage, SO-8; ki_fp_filters: SOIC*3.9x4.9mm*P1.27mm*; Footprint: Package_SO:SOIC-8_3.9x4.9mm_P1.27mm; Supplier: http://files.remont-aud.net/baza/dc_dc/data/APE1707.pdf
footprint SOIC-8_3.9x4.9mm_P1.27mm
pins: 1 VCC (power), 2 SW (out), 3 FB (in), 4 ~{{EN}} (in), 5 VSS (power), 6 VSS hidden, 7 VSS hidden, 8 VSS hidden

## APE1707M-33-HF
designator *  value APE1707M-33-HF
ki_keywords: 3.3V 2A 150KHz PWM Buck DC/DC; ki_description: 2A, 150KHz PWM Buck DC/DC Converter, fixed 3.3V output voltage, SO-8; ki_fp_filters: SOIC*3.9x4.9mm*P1.27mm*; Footprint: Package_SO:SOIC-8_3.9x4.9mm_P1.27mm; Supplier: http://files.remont-aud.net/baza/dc_dc/data/APE1707.pdf
footprint SOIC-8_3.9x4.9mm_P1.27mm
pins: 1 VCC (power), 2 SW (out), 3 FB (in), 4 ~{{EN}} (in), 5 VSS (power), 6 VSS hidden, 7 VSS hidden, 8 VSS hidden

## APE1707M-50-HF
designator *  value APE1707M-50-HF
ki_keywords: 5V 2A 150KHz PWM Buck DC/DC; ki_description: 2A, 150KHz PWM Buck DC/DC Converter, fixed 5.0V output voltage, SO-8; ki_fp_filters: SOIC*3.9x4.9mm*P1.27mm*; Footprint: Package_SO:SOIC-8_3.9x4.9mm_P1.27mm; Supplier: http://files.remont-aud.net/baza/dc_dc/data/APE1707.pdf
footprint SOIC-8_3.9x4.9mm_P1.27mm
pins: 1 VCC (power), 2 SW (out), 3 FB (in), 4 ~{{EN}} (in), 5 VSS (power), 6 VSS hidden, 7 VSS hidden, 8 VSS hidden

## APE1707M-HF
designator *  value APE1707M-HF
ki_keywords: Adjustable 2A 150KHz PWM Buck DC/DC; ki_description: 2A, 150KHz PWM Buck DC/DC Converter, adjustable output voltage, SO-8; ki_fp_filters: SOIC*3.9x4.9mm*P1.27mm*; Footprint: Package_SO:SOIC-8_3.9x4.9mm_P1.27mm; Supplier: http://files.remont-aud.net/baza/dc_dc/data/APE1707.pdf
footprint SOIC-8_3.9x4.9mm_P1.27mm
pins: 1 VCC (power), 2 SW (out), 3 FB (in), 4 ~{{EN}} (in), 5 VSS (power), 6 VSS hidden, 7 VSS hidden, 8 VSS hidden

## APE1707S-12-HF
designator *  value APE1707S-12-HF
ki_keywords: 12V 2A 150KHz PWM Buck DC/DC; ki_description: 2A, 150KHz PWM Buck DC/DC Converter, fixed 12.0V output voltage, TO-263-5 (DD-PAK); ki_fp_filters: TO?263*TabPin3*; Footprint: Package_TO_SOT_SMD:TO-263-5_TabPin3; Supplier: http://pdf.datasheet.live/datasheets-1/advanced_power_electronics/APE1707S-12-HF.pdf
footprint TO-263-5_TabPin3
pins: 1 VCC (power), 2 SW (out), 3 VSS (power), 4 FB (in), 5 ~{{EN}} (in)

## APE1707S-33-HF
designator *  value APE1707S-33-HF
ki_keywords: 3.3V 2A 150KHz PWM Buck DC/DC; ki_description: 2A, 150KHz PWM Buck DC/DC Converter, fixed 3.3V output voltage, TO-263-5 (DD-PAK); ki_fp_filters: TO?263*TabPin3*; Footprint: Package_TO_SOT_SMD:TO-263-5_TabPin3; Supplier: http://pdf.datasheet.live/datasheets-1/advanced_power_electronics/APE1707S-12-HF.pdf
footprint TO-263-5_TabPin3
pins: 1 VCC (power), 2 SW (out), 3 VSS (power), 4 FB (in), 5 ~{{EN}} (in)

## APE1707S-50-HF
designator *  value APE1707S-50-HF
ki_keywords: 5V 2A 150KHz PWM Buck DC/DC; ki_description: 2A, 150KHz PWM Buck DC/DC Converter, fixed 5.0V output voltage, TO-263-5 (DD-PAK); ki_fp_filters: TO?263*TabPin3*; Footprint: Package_TO_SOT_SMD:TO-263-5_TabPin3; Supplier: http://pdf.datasheet.live/datasheets-1/advanced_power_electronics/APE1707S-12-HF.pdf
footprint TO-263-5_TabPin3
pins: 1 VCC (power), 2 SW (out), 3 VSS (power), 4 FB (in), 5 ~{{EN}} (in)

## APE1707S-HF
designator *  value APE1707S-HF
ki_keywords: Adjustable 2A 150KHz PWM Buck DC/DC; ki_description: 2A, 150KHz PWM Buck DC/DC Converter, adjustable output voltage, TO-263-5 (DD-PAK); ki_fp_filters: TO?263*TabPin3*; Footprint: Package_TO_SOT_SMD:TO-263-5_TabPin3; Supplier: http://pdf.datasheet.live/datasheets-1/advanced_power_electronics/APE1707S-12-HF.pdf
footprint TO-263-5_TabPin3
pins: 1 VCC (power), 2 SW (out), 3 VSS (power), 4 FB (in), 5 ~{{EN}} (in)

## BD9G341EFJ
designator *  value BD9G341EFJ
ki_keywords: Buck Converter; ki_description: 12V-76V input voltage range 3A output current, Buck Converter, Integrated FET, HTSOP-8; ki_fp_filters: HTSOP*EP*3.9x4.9mm*P1.27mm*ThermalVias*; Footprint: Package_SO:HTSOP-8-1EP_3.9x4.9mm_P1.27mm_EP2.4x3.2mm_ThermalVias; Supplier: https://media.digikey.com/pdf/Data%20Sheets/Rohm%20PDFs/BD9G341EFJ.pdf
footprint HTSOP-8-1EP_3.9x4.9mm_P1.27mm_EP2.4x3.2mm_ThermalVias
pins: 1 LX, 2 GND (power), 3 VC (out), 4 FB (in), 5 RT (in), 6 EN (in), 7 BST (in), 8 VCC (power)